# Altium integrated library WE_WR-TBL_Pluggable System_5.08 mm_rev15b.IntLib: 266 symbols (part 2 of 2) (continued)
## 691701500007B
designator J?
WR-TBL Terminal Blocks Serie 7015 B - 5.08 mm THR Type; Manufacturer: Würth Elektronik eiSos GmbH; ComponentLink1 Description: Manufacturer; ComponentLink2 Description: Datasheet; NoPins: 07; Created Date: 25 March 2014; partNo: 691701500007B; ComponentLink1URL: http://www.we-online.com; ComponentLink2URL: http://katalog.we-online.de/em/datasheet/6917015000xxB.pdf; Created by: Karrer Zheng
footprint 691701500007B (THR - 5,08mm - PCB Vertical Open - 07p)
pins: 1, 2, 3, 4, 5, 6, 7

## 691701500008B
designator J?
WR-TBL Terminal Blocks Serie 7015 B - 5.08 mm THR Type; Manufacturer: Würth Elektronik eiSos GmbH; ComponentLink1 Description: Manufacturer; ComponentLink2 Description: Datasheet; NoPins: 08; Created Date: 25 March 2014; partNo: 691701500008B; ComponentLink1URL: http://www.we-online.com; ComponentLink2URL: http://katalog.we-online.de/em/datasheet/6917015000xxB.pdf; Created by: Karrer Zheng
footprint 691701500008B (THR - 5,08mm - PCB Vertical Open - 08p)
pins: 1, 2, 3, 4, 5, 6, 7, 8

## 691701500009B
designator J?
WR-TBL Terminal Blocks Serie 7015 B - 5.08 mm THR Type; Manufacturer: Würth Elektronik eiSos GmbH; ComponentLink1 Description: Manufacturer; ComponentLink2 Description: Datasheet; NoPins: 09; Created Date: 25 March 2014; partNo: 691701500009B; ComponentLink1URL: http://www.we-online.com; ComponentLink2URL: http://katalog.we-online.de/em/datasheet/6917015000xxB.pdf; Created by: Karrer Zheng
footprint 691701500009B (THR - 5,08mm - PCB Vertical Open - 09p)
pins: 1, 2, 3, 4, 5, 6, 7, 8, 9

## 691701500010B
designator J?
WR-TBL Terminal Blocks Serie 7015 B - 5.08 mm THR Type; Manufacturer: Würth Elektronik eiSos GmbH; ComponentLink1 Description: Manufacturer; ComponentLink2 Description: Datasheet; NoPins: 10; Created Date: 25 March 2014; partNo: 691701500010B; ComponentLink1URL: http://www.we-online.com; ComponentLink2URL: http://katalog.we-online.de/em/datasheet/6917015000xxB.pdf; Created by: Karrer Zheng
footprint 691701500010B (THR - 5,08mm - PCB Vertical Open - 10p)
pins: 1, 2, 3, 4, 5, 6, 7, 8, 9, 10

## 691701500011B
designator J?
WR-TBL Terminal Blocks Serie 7015 B - 5.08 mm THR Type; Manufacturer: Würth Elektronik eiSos GmbH; ComponentLink1 Description: Manufacturer; ComponentLink2 Description: Datasheet; NoPins: 11; Created Date: 25 March 2014; partNo: 691701500011B; ComponentLink1URL: http://www.we-online.com; ComponentLink2URL: http://katalog.we-online.de/em/datasheet/6917015000xxB.pdf; Created by: Karrer Zheng
footprint 691701500011B (THR - 5,08mm - PCB Vertical Open - 11p)
pins: 1, 2, 3, 4, 5, 6, 7, 8, 9, 10, 11

## 691701500012B
designator J?
WR-TBL Terminal Blocks Serie 7015 B - 5.08 mm THR Type; Manufacturer: Würth Elektronik eiSos GmbH; ComponentLink1 Description: Manufacturer; ComponentLink2 Description: Datasheet; NoPins: 12; Created Date: 25 March 2014; partNo: 691701500012B; ComponentLink1URL: http://www.we-online.com; ComponentLink2URL: http://katalog.we-online.de/em/datasheet/6917015000xxB.pdf; Created by: Karrer Zheng
footprint 691701500012B (THR - 5,08mm - PCB Vertical Open - 12p)
pins: 1, 2, 3, 4, 5, 6, 7, 8, 9, 10, 11, 12


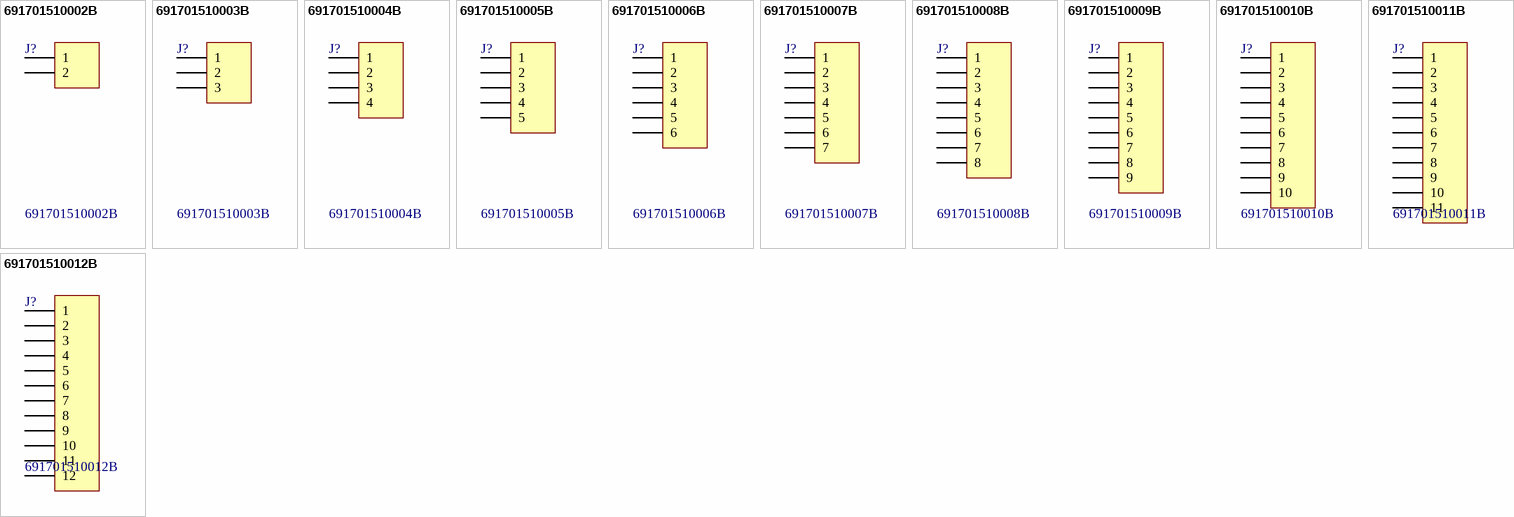
[diagram p20: symbols 691701510002B to 691701510012B]

## 691701510002B
designator J?
WR-TBL Terminal Blocks Serie 7015 B - 5.08 mm THR Type; Manufacturer: Würth Elektronik eiSos GmbH; ComponentLink1 Description: Manufacturer; ComponentLink2 Description: Datasheet; NoPins: 02; Created Date: 9 January 2014; partNo: 691701510002B; ComponentLink1URL: http://www.we-online.com; ComponentLink2URL: http://katalog.we-online.de/em/datasheet/6917015100xxB.pdf; Created by: Karrer Zheng
footprint 691701510002B (THR - 5,08mm - PCB Vertical Close - 02p)
pins: 1, 2

## 691701510003B
designator J?
WR-TBL Terminal Blocks Serie 7015 B - 5.08 mm THR Type; Manufacturer: Würth Elektronik eiSos GmbH; ComponentLink1 Description: Manufacturer; ComponentLink2 Description: Datasheet; NoPins: 03; Created Date: 9 January 2014; partNo: 691701510003B; ComponentLink1URL: http://www.we-online.com; ComponentLink2URL: http://katalog.we-online.de/em/datasheet/6917015100xxB.pdf; Created by: Karrer Zheng
footprint 691701510003B (THR - 5,08mm - PCB Vertical Close - 03p)
pins: 1, 2, 3

## 691701510004B
designator J?
WR-TBL Terminal Blocks Serie 7015 B - 5.08 mm THR Type; Manufacturer: Würth Elektronik eiSos GmbH; ComponentLink1 Description: Manufacturer; ComponentLink2 Description: Datasheet; NoPins: 02; Created Date: 9 January 2014; partNo: 691701510004B; ComponentLink1URL: http://www.we-online.com; ComponentLink2URL: http://katalog.we-online.de/em/datasheet/6917015100xxB.pdf; Created by: Karrer Zheng
footprint 691701510004B (THR - 5,08mm - PCB Vertical Close - 04p)
pins: 1, 2, 3, 4

## 691701510005B
designator J?
WR-TBL Terminal Blocks Serie 7015 B - 5.08 mm THR Type; Manufacturer: Würth Elektronik eiSos GmbH; ComponentLink1 Description: Manufacturer; ComponentLink2 Description: Datasheet; NoPins: 05; Created Date: 9 January 2014; partNo: 691701510005B; ComponentLink1URL: http://www.we-online.com; ComponentLink2URL: http://katalog.we-online.de/em/datasheet/6917015100xxB.pdf; Created by: Karrer Zheng
footprint 691701510005B (THR - 5,08mm - PCB Vertical Close - 05p)
pins: 1, 2, 3, 4, 5

## 691701510006B
designator J?
WR-TBL Terminal Blocks Serie 7015 B - 5.08 mm THR Type; Manufacturer: Würth Elektronik eiSos GmbH; ComponentLink1 Description: Manufacturer; ComponentLink2 Description: Datasheet; NoPins: 06; Created Date: 9 January 2014; partNo: 691701510006B; ComponentLink1URL: http://www.we-online.com; ComponentLink2URL: http://katalog.we-online.de/em/datasheet/6917015100xxB.pdf; Created by: Karrer Zheng
footprint 691701510006B (THR - 5,08mm - PCB Vertical Close - 06p)
pins: 1, 2, 3, 4, 5, 6

## 691701510007B
designator J?
WR-TBL Terminal Blocks Serie 7015 B - 5.08 mm THR Type; Manufacturer: Würth Elektronik eiSos GmbH; ComponentLink1 Description: Manufacturer; ComponentLink2 Description: Datasheet; NoPins: 07; Created Date: 9 January 2014; partNo: 691701510007B; ComponentLink1URL: http://www.we-online.com; ComponentLink2URL: http://katalog.we-online.de/em/datasheet/6917015100xxB.pdf; Created by: Karrer Zheng
footprint 691701510007B (THR - 5,08mm - PCB Vertical Close - 07p)
pins: 1, 2, 3, 4, 5, 6, 7

## 691701510008B
designator J?
WR-TBL Terminal Blocks Serie 7015 B - 5.08 mm THR Type; Manufacturer: Würth Elektronik eiSos GmbH; ComponentLink1 Description: Manufacturer; ComponentLink2 Description: Datasheet; NoPins: 08; Created Date: 9 January 2014; partNo: 691701510008B; ComponentLink1URL: http://www.we-online.com; ComponentLink2URL: http://katalog.we-online.de/em/datasheet/6917015100xxB.pdf; Created by: Karrer Zheng
footprint 691701510008B (THR - 5,08mm - PCB Vertical Close - 08p)
pins: 1, 2, 3, 4, 5, 6, 7, 8

## 691701510009B
designator J?
WR-TBL Terminal Blocks Serie 7015 B - 5.08 mm THR Type; Manufacturer: Würth Elektronik eiSos GmbH; ComponentLink1 Description: Manufacturer; ComponentLink2 Description: Datasheet; NoPins: 09; Created Date: 9 January 2014; partNo: 691701510009B; ComponentLink1URL: http://www.we-online.com; ComponentLink2URL: http://katalog.we-online.de/em/datasheet/6917015100xxB.pdf; Created by: Karrer Zheng
footprint 691701510009B (THR - 5,08mm - PCB Vertical Close - 09p)
pins: 1, 2, 3, 4, 5, 6, 7, 8, 9

## 691701510010B
designator J?
WR-TBL Terminal Blocks Serie 7015 B - 5.08 mm THR Type; Manufacturer: Würth Elektronik eiSos GmbH; ComponentLink1 Description: Manufacturer; ComponentLink2 Description: Datasheet; NoPins: 10; Created Date: 9 January 2014; partNo: 691701510010B; ComponentLink1URL: http://www.we-online.com; ComponentLink2URL: http://katalog.we-online.de/em/datasheet/6917015100xxB.pdf; Created by: Karrer Zheng
footprint 691701510010B (THR - 5,08mm - PCB Vertical Close - 10p)
pins: 1, 2, 3, 4, 5, 6, 7, 8, 9, 10

## 691701510011B
designator J?
WR-TBL Terminal Blocks Serie 7015 B - 5.08 mm THR Type; Manufacturer: Würth Elektronik eiSos GmbH; ComponentLink1 Description: Manufacturer; ComponentLink2 Description: Datasheet; NoPins: 11; Created Date: 9 January 2014; partNo: 691701510011B; ComponentLink1URL: http://www.we-online.com; ComponentLink2URL: http://katalog.we-online.de/em/datasheet/6917015100xxB.pdf; Created by: Karrer Zheng
footprint 691701510011B (THR - 5,08mm - PCB Vertical Close - 11p)
pins: 1, 2, 3, 4, 5, 6, 7, 8, 9, 10, 11

## 691701510012B
designator J?
WR-TBL Terminal Blocks Serie 7015 B - 5.08 mm THR Type; Manufacturer: Würth Elektronik eiSos GmbH; ComponentLink1 Description: Manufacturer; ComponentLink2 Description: Datasheet; NoPins: 12; Created Date: 9 January 2014; partNo: 691701510012B; ComponentLink1URL: http://www.we-online.com; ComponentLink2URL: http://katalog.we-online.de/em/datasheet/6917015100xxB.pdf; Created by: Karrer Zheng
footprint 691701510012B (THR - 5,08mm - PCB Vertical Close - 12p)
pins: 1, 2, 3, 4, 5, 6, 7, 8, 9, 10, 11, 12


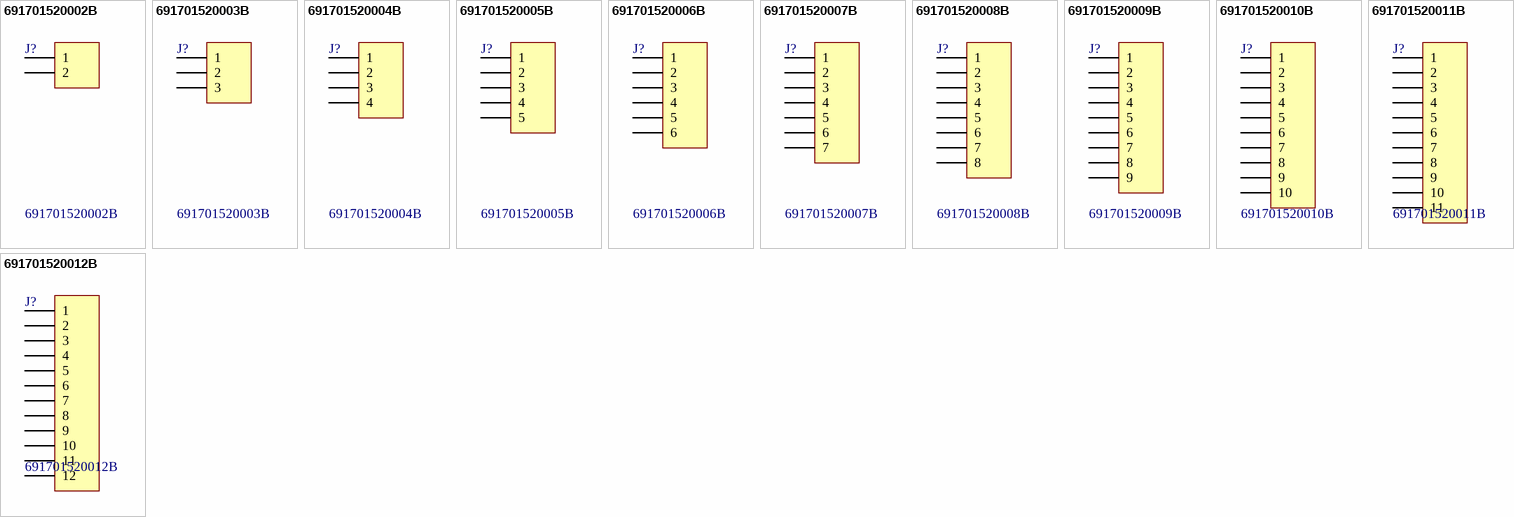
[diagram p21: symbols 691701520002B to 691701520012B]

## 691701520002B
designator J?
WR-TBL Terminal Blocks Serie 7015 B - 5.08 mm THR Type with Flanges; Manufacturer: Würth Elektronik eiSos GmbH; ComponentLink1 Description: Manufacturer; ComponentLink2 Description: Datasheet; NoPins: 02; Created Date: 25 March 2014; partNo: 691701520002B; ComponentLink1URL: http://www.we-online.com; ComponentLink2URL: http://katalog.we-online.de/em/datasheet/6917015200xxB.pdf; Created by: Karrer Zheng
footprint 691701520002B (THR - 5,08mm - PCB Vertical Flange - 02p)
pins: 1, 2

## 691701520003B
designator J?
WR-TBL Terminal Blocks Serie 7015 B - 5.08 mm THR Type with Flanges; Manufacturer: Würth Elektronik eiSos GmbH; ComponentLink1 Description: Manufacturer; ComponentLink2 Description: Datasheet; NoPins: 03; Created Date: 25 March 2014; partNo: 691701520003B; ComponentLink1URL: http://www.we-online.com; ComponentLink2URL: http://katalog.we-online.de/em/datasheet/6917015200xxB.pdf; Created by: Karrer Zheng
footprint 691701520003B (THR - 5,08mm - PCB Vertical Flange - 03p)
pins: 1, 2, 3

## 691701520004B
designator J?
WR-TBL Terminal Blocks Serie 7015 B - 5.08 mm THR Type with Flanges; Manufacturer: Würth Elektronik eiSos GmbH; ComponentLink1 Description: Manufacturer; ComponentLink2 Description: Datasheet; NoPins: 04; Created Date: 25 March 2014; partNo: 691701520004B; ComponentLink1URL: http://www.we-online.com; ComponentLink2URL: http://katalog.we-online.de/em/datasheet/6917015200xxB.pdf; Created by: Karrer Zheng
footprint 691701520004B (THR - 5,08mm - PCB Vertical Flange - 04p)
pins: 1, 2, 3, 4

## 691701520005B
designator J?
WR-TBL Terminal Blocks Serie 7015 B - 5.08 mm THR Type with Flanges; Manufacturer: Würth Elektronik eiSos GmbH; ComponentLink1 Description: Manufacturer; ComponentLink2 Description: Datasheet; NoPins: 05; Created Date: 25 March 2014; partNo: 691701520005B; ComponentLink1URL: http://www.we-online.com; ComponentLink2URL: http://katalog.we-online.de/em/datasheet/6917015200xxB.pdf; Created by: Karrer Zheng
footprint 691701520005B (THR - 5,08mm - PCB Vertical Flange - 05p)
pins: 1, 2, 3, 4, 5

## 691701520006B
designator J?
WR-TBL Terminal Blocks Serie 7015 B - 5.08 mm THR Type with Flanges; Manufacturer: Würth Elektronik eiSos GmbH; ComponentLink1 Description: Manufacturer; ComponentLink2 Description: Datasheet; NoPins: 06; Created Date: 25 March 2014; partNo: 691701520006B; ComponentLink1URL: http://www.we-online.com; ComponentLink2URL: http://katalog.we-online.de/em/datasheet/6917015200xxB.pdf; Created by: Karrer Zheng
footprint 691701520006B (THR - 5,08mm - PCB Vertical Flange - 06p)
pins: 1, 2, 3, 4, 5, 6

## 691701520007B
designator J?
WR-TBL Terminal Blocks Serie 7015 B - 5.08 mm THR Type with Flanges; Manufacturer: Würth Elektronik eiSos GmbH; ComponentLink1 Description: Manufacturer; ComponentLink2 Description: Datasheet; NoPins: 07; Created Date: 25 March 2014; partNo: 691701520007B; ComponentLink1URL: http://www.we-online.com; ComponentLink2URL: http://katalog.we-online.de/em/datasheet/6917015200xxB.pdf; Created by: Karrer Zheng
footprint 691701520007B (THR - 5,08mm - PCB Vertical Flange - 07p)
pins: 1, 2, 3, 4, 5, 6, 7

## 691701520008B
designator J?
WR-TBL Terminal Blocks Serie 7015 B - 5.08 mm THR Type with Flanges; Manufacturer: Würth Elektronik eiSos GmbH; ComponentLink1 Description: Manufacturer; ComponentLink2 Description: Datasheet; NoPins: 08; Created Date: 25 March 2014; partNo: 691701520008B; ComponentLink1URL: http://www.we-online.com; ComponentLink2URL: http://katalog.we-online.de/em/datasheet/6917015200xxB.pdf; Created by: Karrer Zheng
footprint 691701520008B (THR - 5,08mm - PCB Vertical Flange - 08p)
pins: 1, 2, 3, 4, 5, 6, 7, 8

## 691701520009B
designator J?
WR-TBL Terminal Blocks Serie 7015 B - 5.08 mm THR Type with Flanges; Manufacturer: Würth Elektronik eiSos GmbH; ComponentLink1 Description: Manufacturer; ComponentLink2 Description: Datasheet; NoPins: 09; Created Date: 25 March 2014; partNo: 691701520009B; ComponentLink1URL: http://www.we-online.com; ComponentLink2URL: http://katalog.we-online.de/em/datasheet/6917015200xxB.pdf; Created by: Karrer Zheng
footprint 691701520009B (THR - 5,08mm - PCB Vertical Flange - 09p)
pins: 1, 2, 3, 4, 5, 6, 7, 8, 9

## 691701520010B
designator J?
WR-TBL Terminal Blocks Serie 7015 B - 5.08 mm THR Type with Flanges; Manufacturer: Würth Elektronik eiSos GmbH; ComponentLink1 Description: Manufacturer; ComponentLink2 Description: Datasheet; NoPins: 10; Created Date: 25 March 2014; partNo: 691701520010B; ComponentLink1URL: http://www.we-online.com; ComponentLink2URL: http://katalog.we-online.de/em/datasheet/6917015200xxB.pdf; Created by: Karrer Zheng
footprint 691701520010B (THR - 5,08mm - PCB Vertical Flange - 10p)
pins: 1, 2, 3, 4, 5, 6, 7, 8, 9, 10

## 691701520011B
designator J?
WR-TBL Terminal Blocks Serie 7015 B - 5.08 mm THR Type with Flanges; Manufacturer: Würth Elektronik eiSos GmbH; ComponentLink1 Description: Manufacturer; ComponentLink2 Description: Datasheet; NoPins: 11; Created Date: 25 March 2014; partNo: 691701520011B; ComponentLink1URL: http://www.we-online.com; ComponentLink2URL: http://katalog.we-online.de/em/datasheet/6917015200xxB.pdf; Created by: Karrer Zheng
footprint 691701520011B (THR - 5,08mm - PCB Vertical Flange - 11p)
pins: 1, 2, 3, 4, 5, 6, 7, 8, 9, 10, 11

## 691701520012B
designator J?
WR-TBL Terminal Blocks Serie 7015 B - 5.08 mm THR Type with Flanges; Manufacturer: Würth Elektronik eiSos GmbH; ComponentLink1 Description: Manufacturer; ComponentLink2 Description: Datasheet; NoPins: 12; Created Date: 25 March 2014; partNo: 691701520012B; ComponentLink1URL: http://www.we-online.com; ComponentLink2URL: http://katalog.we-online.de/em/datasheet/6917015200xxB.pdf; Created by: Karrer Zheng
footprint 691701520012B (THR - 5,08mm - PCB Vertical Flange - 12p)
pins: 1, 2, 3, 4, 5, 6, 7, 8, 9, 10, 11, 12


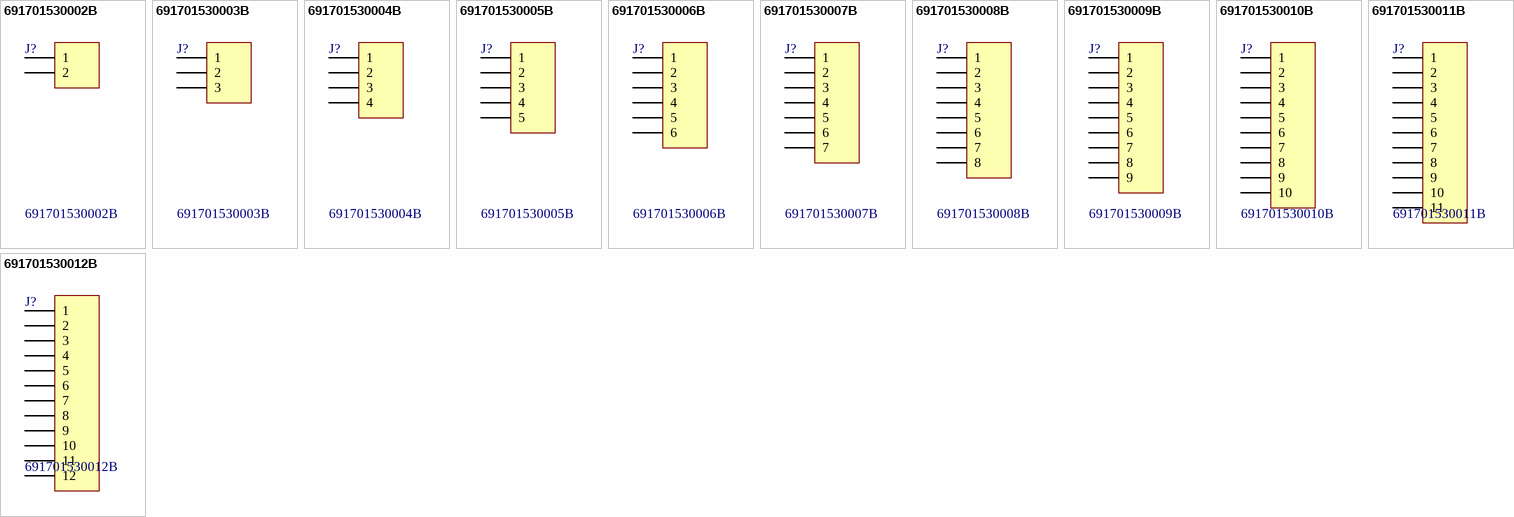
[diagram p22: symbols 691701530002B to 691701530012B]

## 691701530002B
designator J?
WR-TBL Terminal Blocks Serie 7015 B - 5.08 mm THR Type; Manufacturer: Würth Elektronik eiSos GmbH; ComponentLink1 Description: Manufacturer; ComponentLink2 Description: Datasheet; NoPins: 02; Created Date: 31 March 2014; partNo: 691701530002B; ComponentLink1URL: http://www.we-online.com; ComponentLink2URL: http://katalog.we-online.de/em/datasheet/6917015300xxB.pdf; Created by: Karrer Zheng
footprint 691701530002B (THR - 5,08mm - PCB Horizontal Open - 02p)
pins: 1, 2

## 691701530003B
designator J?
WR-TBL Terminal Blocks Serie 7015 B - 5.08 mm THR Type; Manufacturer: Würth Elektronik eiSos GmbH; ComponentLink1 Description: Manufacturer; ComponentLink2 Description: Datasheet; NoPins: 03; Created Date: 31 March 2014; partNo: 691701530003B; ComponentLink1URL: http://www.we-online.com; ComponentLink2URL: http://katalog.we-online.de/em/datasheet/6917015300xxB.pdf; Created by: Karrer Zheng
footprint 691701530003B (THR - 5,08mm - PCB Horizontal Open - 03p)
pins: 1, 2, 3

## 691701530004B
designator J?
WR-TBL Terminal Blocks Serie 7015 B - 5.08 mm THR Type; Manufacturer: Würth Elektronik eiSos GmbH; ComponentLink1 Description: Manufacturer; ComponentLink2 Description: Datasheet; NoPins: 04; Created Date: 31 March 2014; partNo: 691701530004B; ComponentLink1URL: http://www.we-online.com; ComponentLink2URL: http://katalog.we-online.de/em/datasheet/6917015300xxB.pdf; Created by: Karrer Zheng
footprint 691701530004B (THR - 5,08mm - PCB Horizontal Open - 04p)
pins: 1, 2, 3, 4

## 691701530005B
designator J?
WR-TBL Terminal Blocks Serie 7015 B - 5.08 mm THR Type; Manufacturer: Würth Elektronik eiSos GmbH; ComponentLink1 Description: Manufacturer; ComponentLink2 Description: Datasheet; NoPins: 05; Created Date: 31 March 2014; partNo: 691701530005B; ComponentLink1URL: http://www.we-online.com; ComponentLink2URL: http://katalog.we-online.de/em/datasheet/6917015300xxB.pdf; Created by: Karrer Zheng
footprint 691701530005B (THR - 5,08mm - PCB Horizontal Open - 05p)
pins: 1, 2, 3, 4, 5

## 691701530006B
designator J?
WR-TBL Terminal Blocks Serie 7015 B - 5.08 mm THR Type; Manufacturer: Würth Elektronik eiSos GmbH; ComponentLink1 Description: Manufacturer; ComponentLink2 Description: Datasheet; NoPins: 06; Created Date: 31 March 2014; partNo: 691701530006B; ComponentLink1URL: http://www.we-online.com; ComponentLink2URL: http://katalog.we-online.de/em/datasheet/6917015300xxB.pdf; Created by: Karrer Zheng
footprint 691701530006B (THR - 5,08mm - PCB Horizontal Open - 06p)
pins: 1, 2, 3, 4, 5, 6

## 691701530007B
designator J?
WR-TBL Terminal Blocks Serie 7015 B - 5.08 mm THR Type; Manufacturer: Würth Elektronik eiSos GmbH; ComponentLink1 Description: Manufacturer; ComponentLink2 Description: Datasheet; NoPins: 07; Created Date: 31 March 2014; partNo: 691701530007B; ComponentLink1URL: http://www.we-online.com; ComponentLink2URL: http://katalog.we-online.de/em/datasheet/6917015300xxB.pdf; Created by: Karrer Zheng
footprint 691701530007B (THR - 5,08mm - PCB Horizontal Open - 07p)
pins: 1, 2, 3, 4, 5, 6, 7

## 691701530008B
designator J?
WR-TBL Terminal Blocks Serie 7015 B - 5.08 mm THR Type; Manufacturer: Würth Elektronik eiSos GmbH; ComponentLink1 Description: Manufacturer; ComponentLink2 Description: Datasheet; NoPins: 08; Created Date: 31 March 2014; partNo: 691701530008B; ComponentLink1URL: http://www.we-online.com; ComponentLink2URL: http://katalog.we-online.de/em/datasheet/6917015300xxB.pdf; Created by: Karrer Zheng
footprint 691701530008B (THR - 5,08mm - PCB Horizontal Open - 08p)
pins: 1, 2, 3, 4, 5, 6, 7, 8

## 691701530009B
designator J?
WR-TBL Terminal Blocks Serie 7015 B - 5.08 mm THR Type; Manufacturer: Würth Elektronik eiSos GmbH; ComponentLink1 Description: Manufacturer; ComponentLink2 Description: Datasheet; NoPins: 09; Created Date: 31 March 2014; partNo: 691701530009B; ComponentLink1URL: http://www.we-online.com; ComponentLink2URL: http://katalog.we-online.de/em/datasheet/6917015300xxB.pdf; Created by: Karrer Zheng
footprint 691701530009B (THR - 5,08mm - PCB Horizontal Open - 09p)
pins: 1, 2, 3, 4, 5, 6, 7, 8, 9

## 691701530010B
designator J?
WR-TBL Terminal Blocks Serie 7015 B - 5.08 mm THR Type; Manufacturer: Würth Elektronik eiSos GmbH; ComponentLink1 Description: Manufacturer; ComponentLink2 Description: Datasheet; NoPins: 10; Created Date: 31 March 2014; partNo: 691701530010B; ComponentLink1URL: http://www.we-online.com; ComponentLink2URL: http://katalog.we-online.de/em/datasheet/6917015300xxB.pdf; Created by: Karrer Zheng
footprint 691701530010B (THR - 5,08mm - PCB Horizontal Open - 10p)
pins: 1, 2, 3, 4, 5, 6, 7, 8, 9, 10

## 691701530011B
designator J?
WR-TBL Terminal Blocks Serie 7015 B - 5.08 mm THR Type; Manufacturer: Würth Elektronik eiSos GmbH; ComponentLink1 Description: Manufacturer; ComponentLink2 Description: Datasheet; NoPins: 11; Created Date: 31 March 2014; partNo: 691701530011B; ComponentLink1URL: http://www.we-online.com; ComponentLink2URL: http://katalog.we-online.de/em/datasheet/6917015300xxB.pdf; Created by: Karrer Zheng
footprint 691701530011B (THR - 5,08mm - PCB Horizontal Open - 11p)
pins: 1, 2, 3, 4, 5, 6, 7, 8, 9, 10, 11

## 691701530012B
designator J?
WR-TBL Terminal Blocks Serie 7015 B - 5.08 mm THR Type; Manufacturer: Würth Elektronik eiSos GmbH; ComponentLink1 Description: Manufacturer; ComponentLink2 Description: Datasheet; NoPins: 12; Created Date: 31 March 2014; partNo: 691701530012B; ComponentLink1URL: http://www.we-online.com; ComponentLink2URL: http://katalog.we-online.de/em/datasheet/6917015300xxB.pdf; Created by: Karrer Zheng
footprint 691701530012B (THR - 5,08mm - PCB Horizontal Open - 12p)
pins: 1, 2, 3, 4, 5, 6, 7, 8, 9, 10, 11, 12


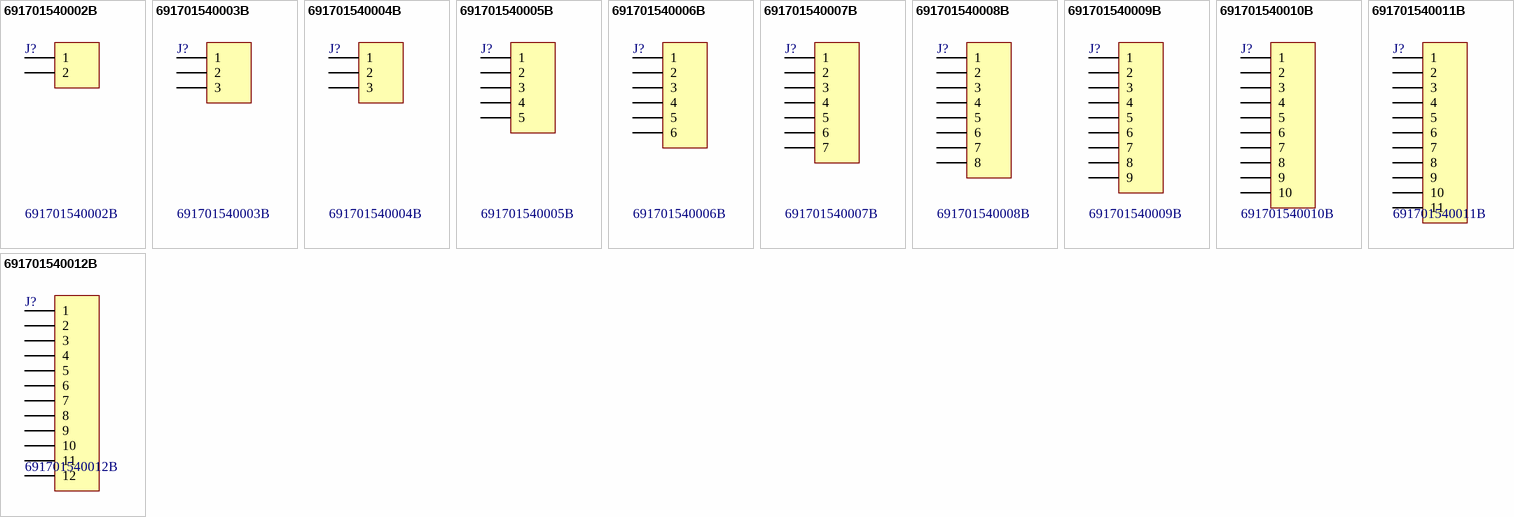
[diagram p23: symbols 691701540002B to 691701540012B]

## 691701540002B
designator J?
WR-TBL Terminal Blocks Serie 7015 B - 5.08 mm THR Type; Manufacturer: Würth Elektronik eiSos GmbH; ComponentLink1 Description: Manufacturer; ComponentLink2 Description: Datasheet; NoPins: 02; Created Date: 31 March 2014; partNo: 691701540002B; ComponentLink1URL: http://www.we-online.com; ComponentLink2URL: http://katalog.we-online.de/em/datasheet/6917015400xxB.pdf; Created by: Karrer Zheng
footprint 691701540002B (THR - 5,08mm - PCB Horizontal Close - 02p)
pins: 1, 2

## 691701540003B
designator J?
WR-TBL Terminal Blocks Serie 7015 B - 5.08 mm THR Type; Manufacturer: Würth Elektronik eiSos GmbH; ComponentLink1 Description: Manufacturer; ComponentLink2 Description: Datasheet; NoPins: 03; Created Date: 31 March 2014; partNo: 691701540003B; ComponentLink1URL: http://www.we-online.com; ComponentLink2URL: http://katalog.we-online.de/em/datasheet/6917015400xxB.pdf; Created by: Karrer Zheng
footprint 691701540003B (THR - 5,08mm - PCB Horizontal Close - 03p)
pins: 1, 2, 3

## 691701540004B
designator J?
WR-TBL Terminal Blocks Serie 7015 B - 5.08 mm THR Type; Manufacturer: Würth Elektronik eiSos GmbH; ComponentLink1 Description: Manufacturer; ComponentLink2 Description: Datasheet; NoPins: 04; Created Date: 31 March 2014; partNo: 691701540004B; ComponentLink1URL: http://www.we-online.com; ComponentLink2URL: http://katalog.we-online.de/em/datasheet/6917015400xxB.pdf; Created by: Karrer Zheng
footprint 691701540004B (THR - 5,08mm - PCB Horizontal Close - 04p)
pins: 1, 2, 3

## 691701540005B
designator J?
WR-TBL Terminal Blocks Serie 7015 B - 5.08 mm THR Type; Manufacturer: Würth Elektronik eiSos GmbH; ComponentLink1 Description: Manufacturer; ComponentLink2 Description: Datasheet; NoPins: 05; Created Date: 31 March 2014; partNo: 691701540005B; ComponentLink1URL: http://www.we-online.com; ComponentLink2URL: http://katalog.we-online.de/em/datasheet/6917015400xxB.pdf; Created by: Karrer Zheng
footprint 691701540005B (THR - 5,08mm - PCB Horizontal Close - 05p)
pins: 1, 2, 3, 4, 5

## 691701540006B
designator J?
WR-TBL Terminal Blocks Serie 7015 B - 5.08 mm THR Type; Manufacturer: Würth Elektronik eiSos GmbH; ComponentLink1 Description: Manufacturer; ComponentLink2 Description: Datasheet; NoPins: 06; Created Date: 31 March 2014; partNo: 691701540006B; ComponentLink1URL: http://www.we-online.com; ComponentLink2URL: http://katalog.we-online.de/em/datasheet/6917015400xxB.pdf; Created by: Karrer Zheng
footprint 691701540006B (THR - 5,08mm - PCB Horizontal Close - 06p)
pins: 1, 2, 3, 4, 5, 6

## 691701540007B
designator J?
WR-TBL Terminal Blocks Serie 7015 B - 5.08 mm THR Type; Manufacturer: Würth Elektronik eiSos GmbH; ComponentLink1 Description: Manufacturer; ComponentLink2 Description: Datasheet; NoPins: 07; Created Date: 31 March 2014; partNo: 691701540007B; ComponentLink1URL: http://www.we-online.com; ComponentLink2URL: http://katalog.we-online.de/em/datasheet/6917015400xxB.pdf; Created by: Karrer Zheng
footprint 691701540007B (THR - 5,08mm - PCB Horizontal Close - 07p)
pins: 1, 2, 3, 4, 5, 6, 7

## 691701540008B
designator J?
WR-TBL Terminal Blocks Serie 7015 B - 5.08 mm THR Type; Manufacturer: Würth Elektronik eiSos GmbH; ComponentLink1 Description: Manufacturer; ComponentLink2 Description: Datasheet; NoPins: 08; Created Date: 31 March 2014; partNo: 691701540008B; ComponentLink1URL: http://www.we-online.com; ComponentLink2URL: http://katalog.we-online.de/em/datasheet/6917015400xxB.pdf; Created by: Karrer Zheng
footprint 691701540008B (THR - 5,08mm - PCB Horizontal Close - 08p)
pins: 1, 2, 3, 4, 5, 6, 7, 8

## 691701540009B
designator J?
WR-TBL Terminal Blocks Serie 7015 B - 5.08 mm THR Type; Manufacturer: Würth Elektronik eiSos GmbH; ComponentLink1 Description: Manufacturer; ComponentLink2 Description: Datasheet; NoPins: 09; Created Date: 31 March 2014; partNo: 691701540009B; ComponentLink1URL: http://www.we-online.com; ComponentLink2URL: http://katalog.we-online.de/em/datasheet/6917015400xxB.pdf; Created by: Karrer Zheng
footprint 691701540009B (THR - 5,08mm - PCB Horizontal Close - 09p)
pins: 1, 2, 3, 4, 5, 6, 7, 8, 9

## 691701540010B
designator J?
WR-TBL Terminal Blocks Serie 7015 B - 5.08 mm THR Type; Manufacturer: Würth Elektronik eiSos GmbH; ComponentLink1 Description: Manufacturer; ComponentLink2 Description: Datasheet; NoPins: 10; Created Date: 31 March 2014; partNo: 691701540010B; ComponentLink1URL: http://www.we-online.com; ComponentLink2URL: http://katalog.we-online.de/em/datasheet/6917015400xxB.pdf; Created by: Karrer Zheng
footprint 691701540010B (THR - 5,08mm - PCB Horizontal Close - 10p)
pins: 1, 2, 3, 4, 5, 6, 7, 8, 9, 10

## 691701540011B
designator J?
WR-TBL Terminal Blocks Serie 7015 B - 5.08 mm THR Type; Manufacturer: Würth Elektronik eiSos GmbH; ComponentLink1 Description: Manufacturer; ComponentLink2 Description: Datasheet; NoPins: 11; Created Date: 31 March 2014; partNo: 691701540011B; ComponentLink1URL: http://www.we-online.com; ComponentLink2URL: http://katalog.we-online.de/em/datasheet/6917015400xxB.pdf; Created by: Karrer Zheng
footprint 691701540011B (THR - 5,08mm - PCB Horizontal Close - 11p)
pins: 1, 2, 3, 4, 5, 6, 7, 8, 9, 10, 11

## 691701540012B
designator J?
WR-TBL Terminal Blocks Serie 7015 B - 5.08 mm THR Type; Manufacturer: Würth Elektronik eiSos GmbH; ComponentLink1 Description: Manufacturer; ComponentLink2 Description: Datasheet; NoPins: 12; Created Date: 31 March 2014; partNo: 691701540012B; ComponentLink1URL: http://www.we-online.com; ComponentLink2URL: http://katalog.we-online.de/em/datasheet/6917015400xxB.pdf; Created by: Karrer Zheng
footprint 691701540012B (THR - 5,08mm - PCB Horizontal Close - 12p)
pins: 1, 2, 3, 4, 5, 6, 7, 8, 9, 10, 11, 12


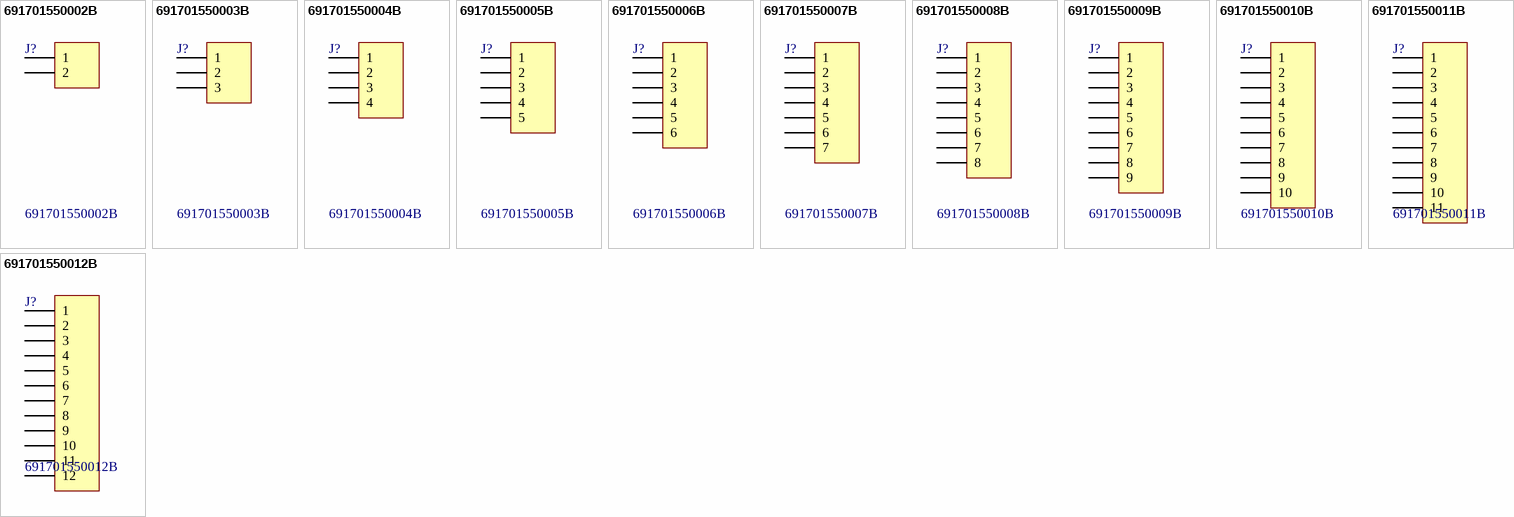
[diagram p24: symbols 691701550002B to 691701550012B]

## 691701550002B
designator J?
WR-TBL Terminal Blocks Serie 7015 B - 5.08 mm THR Type with Flanges; Manufacturer: Würth Elektronik eiSos GmbH; ComponentLink1 Description: Manufacturer; ComponentLink2 Description: Datasheet; NoPins: 02; Created Date: 09 April 2014; partNo: 691701550002B; ComponentLink1URL: http://www.we-online.com; ComponentLink2URL: http://katalog.we-online.de/em/datasheet/6917015500xxB.pdf; Created by: Karrer Zheng
footprint 691701550002B (THR - 5,08mm - PCB Horizontal Flange - 02p)
pins: 1, 2

## 691701550003B
designator J?
WR-TBL Terminal Blocks Serie 7015 B - 5.08 mm THR Type with Flanges; Manufacturer: Würth Elektronik eiSos GmbH; ComponentLink1 Description: Manufacturer; ComponentLink2 Description: Datasheet; NoPins: 03; Created Date: 09 April 2014; partNo: 691701550003B; ComponentLink1URL: http://www.we-online.com; ComponentLink2URL: http://katalog.we-online.de/em/datasheet/6917015500xxB.pdf; Created by: Karrer Zheng
footprint 691701550003B (THR - 5,08mm - PCB Horizontal Flange - 03p)
pins: 1, 2, 3

## 691701550004B
designator J?
WR-TBL Terminal Blocks Serie 7015 B - 5.08 mm THR Type with Flanges; Manufacturer: Würth Elektronik eiSos GmbH; ComponentLink1 Description: Manufacturer; ComponentLink2 Description: Datasheet; NoPins: 04; Created Date: 09 April 2014; partNo: 691701550004B; ComponentLink1URL: http://www.we-online.com; ComponentLink2URL: http://katalog.we-online.de/em/datasheet/6917015500xxB.pdf; Created by: Karrer Zheng
footprint 691701550004B (THR - 5,08mm - PCB Horizontal Flange - 04p)
pins: 1, 2, 3, 4

## 691701550005B
designator J?
WR-TBL Terminal Blocks Serie 7015 B - 5.08 mm THR Type with Flanges; Manufacturer: Würth Elektronik eiSos GmbH; ComponentLink1 Description: Manufacturer; ComponentLink2 Description: Datasheet; NoPins: 05; Created Date: 09 April 2014; partNo: 691701550005B; ComponentLink1URL: http://www.we-online.com; ComponentLink2URL: http://katalog.we-online.de/em/datasheet/6917015500xxB.pdf; Created by: Karrer Zheng
footprint 691701550005B (THR - 5,08mm - PCB Horizontal Flange - 05p)
pins: 1, 2, 3, 4, 5

## 691701550006B
designator J?
WR-TBL Terminal Blocks Serie 7015 B - 5.08 mm THR Type with Flanges; Manufacturer: Würth Elektronik eiSos GmbH; ComponentLink1 Description: Manufacturer; ComponentLink2 Description: Datasheet; NoPins: 06; Created Date: 09 April 2014; partNo: 691701550006B; ComponentLink1URL: http://www.we-online.com; ComponentLink2URL: http://katalog.we-online.de/em/datasheet/6917015500xxB.pdf; Created by: Karrer Zheng
footprint 691701550006B (THR - 5,08mm - PCB Horizontal Flange - 06p)
pins: 1, 2, 3, 4, 5, 6

## 691701550007B
designator J?
WR-TBL Terminal Blocks Serie 7015 B - 5.08 mm THR Type with Flanges; Manufacturer: Würth Elektronik eiSos GmbH; ComponentLink1 Description: Manufacturer; ComponentLink2 Description: Datasheet; NoPins: 07; Created Date: 09 April 2014; partNo: 691701550007B; ComponentLink1URL: http://www.we-online.com; ComponentLink2URL: http://katalog.we-online.de/em/datasheet/6917015500xxB.pdf; Created by: Karrer Zheng
footprint 691701550007B (THR - 5,08mm - PCB Horizontal Flange - 07p)
pins: 1, 2, 3, 4, 5, 6, 7

## 691701550008B
designator J?
WR-TBL Terminal Blocks Serie 7015 B - 5.08 mm THR Type with Flanges; Manufacturer: Würth Elektronik eiSos GmbH; ComponentLink1 Description: Manufacturer; ComponentLink2 Description: Datasheet; NoPins: 08; Created Date: 09 April 2014; partNo: 691701550008B; ComponentLink1URL: http://www.we-online.com; ComponentLink2URL: http://katalog.we-online.de/em/datasheet/6917015500xxB.pdf; Created by: Karrer Zheng
footprint 691701550008B (THR - 5,08mm - PCB Horizontal Flange - 08p)
pins: 1, 2, 3, 4, 5, 6, 7, 8

## 691701550009B
designator J?
WR-TBL Terminal Blocks Serie 7015 B - 5.08 mm THR Type with Flanges; Manufacturer: Würth Elektronik eiSos GmbH; ComponentLink1 Description: Manufacturer; ComponentLink2 Description: Datasheet; NoPins: 09; Created Date: 09 April 2014; partNo: 691701550009B; ComponentLink1URL: http://www.we-online.com; ComponentLink2URL: http://katalog.we-online.de/em/datasheet/6917015500xxB.pdf; Created by: Karrer Zheng
footprint 691701550009B (THR - 5,08mm - PCB Horizontal Flange - 09p)
pins: 1, 2, 3, 4, 5, 6, 7, 8, 9

## 691701550010B
designator J?
WR-TBL Terminal Blocks Serie 7015 B - 5.08 mm THR Type with Flanges; Manufacturer: Würth Elektronik eiSos GmbH; ComponentLink1 Description: Manufacturer; ComponentLink2 Description: Datasheet; NoPins: 10; Created Date: 09 April 2014; partNo: 691701550010B; ComponentLink1URL: http://www.we-online.com; ComponentLink2URL: http://katalog.we-online.de/em/datasheet/6917015500xxB.pdf; Created by: Karrer Zheng
footprint 691701550010B (THR - 5,08mm - PCB Horizontal Flange - 10p)
pins: 1, 2, 3, 4, 5, 6, 7, 8, 9, 10

## 691701550011B
designator J?
WR-TBL Terminal Blocks Serie 7015 B - 5.08 mm THR Type with Flanges; Manufacturer: Würth Elektronik eiSos GmbH; ComponentLink1 Description: Manufacturer; ComponentLink2 Description: Datasheet; NoPins: 11; Created Date: 09 April 2014; partNo: 691701550011B; ComponentLink1URL: http://www.we-online.com; ComponentLink2URL: http://katalog.we-online.de/em/datasheet/6917015500xxB.pdf; Created by: Karrer Zheng
footprint 691701550011B (THR - 5,08mm - PCB Horizontal Flange - 11p)
pins: 1, 2, 3, 4, 5, 6, 7, 8, 9, 10, 11

## 691701550012B
designator J?
WR-TBL Terminal Blocks Serie 7015 B - 5.08 mm THR Type with Flanges; Manufacturer: Würth Elektronik eiSos GmbH; ComponentLink1 Description: Manufacturer; ComponentLink2 Description: Datasheet; NoPins: 12; Created Date: 09 April 2014; partNo: 691701550012B; ComponentLink1URL: http://www.we-online.com; ComponentLink2URL: http://katalog.we-online.de/em/datasheet/6917015500xxB.pdf; Created by: Karrer Zheng
footprint 691701550012B (THR - 5,08mm - PCB Horizontal Flange - 12p)
pins: 1, 2, 3, 4, 5, 6, 7, 8, 9, 10, 11, 12